# Altium footprint library LHAC-4XDSP2XV7-VP5_0226_3.PcbLib: 96 footprints (part 4 of 12) (continued)
## CSG324 [mil] "CSG324" (continued)
via -62.98,94.48 diameter 18 hole 10
via 157.47,-188.97 diameter 18 hole 10
via 94.48,-125.98 diameter 18 hole 10
via 62.98,62.98 diameter 18 hole 10
via 125.98,62.98 diameter 18 hole 10
via 94.48,31.49 diameter 18 hole 10
via 220.46,31.49 diameter 18 hole 10
via 62.98,-31.49 diameter 18 hole 10
via 94.48,-62.98 diameter 18 hole 10
via 188.97,-94.48 diameter 18 hole 10
via 283.46,-125.98 diameter 18 hole 10
via 251.96,-220.46 diameter 18 hole 10
via -188.97,157.47 diameter 18 hole 10
via -0.01,125.98 diameter 18 hole 10
via -62.98,157.47 diameter 18 hole 10
via -62.98,220.46 diameter 18 hole 10
via -94.48,125.98 diameter 18 hole 10
via -157.47,251.96 diameter 18 hole 10
via -251.97,283.47 diameter 18 hole 10
via -283.46,188.97 diameter 18 hole 10
via 251.96,125.98 diameter 18 hole 10
via 283.46,220.46 diameter 18 hole 10
via 157.47,157.47 diameter 18 hole 10
via 188.97,251.96 diameter 18 hole 10
via 94.49,283.47 diameter 18 hole 10
via 62.98,188.97 diameter 18 hole 10
via 62.98,125.98 diameter 18 hole 10
Top Layer:
  lines w5: -15.75,-267.72 -0.01,-283.46 ; -15.75,-236.22 -0.01,-251.96 ; 267.72,-236.22 299.21,-236.22 314.96,-251.97 ; 267.72,-204.72 299.21,-204.72 314.95,-220.46
  lines w6: -283.46,-220.46 -267.72,-204.72 ; -283.46,-188.97 -267.72,-173.23 ; -283.46,-125.98 -267.72,-110.24 ; -283.47,-94.49 -267.72,-78.74 ; -283.46,-62.98 -267.72,-47.24 ; -283.46,-31.49 -267.72,-15.75 ; -283.46,62.98 -267.72,47.24 ; -283.47,94.49 -267.72,78.74 ; -283.46,125.98 -267.72,110.24 ; -283.46,157.47 -267.72,141.73 ; -283.46,220.46 -267.72,204.72 ; -251.96,-188.97 -236.22,-173.23 ; -251.96,-125.98 -236.22,-110.24 ; -251.97,-94.49 -236.22,-78.74 ; -251.96,-31.49 -236.22,-15.75 ; -251.96,31.49 -236.22,15.75 ; -251.96,62.98 -236.22,47.24 ; -251.97,94.49 -236.22,78.74 ; -251.96,220.46 -236.22,204.72 ; -220.46,-220.46 -204.72,-204.72 ; -220.46,-188.97 -204.72,-173.23 ; -220.46,-94.48 -204.72,-78.74 ; -220.46,-31.49 -204.72,-15.75 ; -220.46,31.49 -204.72,15.75 ; -220.46,94.48 -204.72,78.74 ; -188.97,-125.98 -173.23,-110.24 ; -188.97,-94.48 -173.23,-78.74 ; -188.97,-62.98 -173.23,-47.24 ; -188.97,31.49 -173.23,15.75 ; -188.97,62.98 -173.23,47.24 ; -188.97,94.48 -173.23,78.74 ; -188.97,251.97 -188.97,251.98 -173.23,267.72 ; -157.47,-188.97 -141.73,-173.23 ; -157.47,-31.49 -141.73,-15.75 ; -157.47,62.98 -141.73,47.24 ; -157.47,157.47 -141.73,141.73 ; -157.47,283.46 -141.73,267.72 ; -125.98,-283.46 -110.24,-267.72 ; -125.98,-251.96 -110.24,-236.22 ; -125.98,-220.46 -110.24,-204.72 ; -125.98,-188.97 -110.24,-173.23 ; -125.98,-125.98 -110.24,-110.24 ; -125.98,-94.48 -110.24,-78.74 ; -125.98,62.98 -110.24,47.24 ; -125.98,94.48 -110.24,78.74 ; -125.98,125.98 -110.24,110.24 ; -125.98,157.47 -110.24,141.73 ; -125.98,220.46 -110.24,204.72 ; -125.98,251.96 -110.24,236.22 ; -125.98,283.46 -110.24,267.72 ; -94.49,-283.47 -78.74,-267.72 ; -94.49,-251.97 -78.74,-236.22 ; -94.48,-188.97 -78.74,-173.23 ; -94.48,-157.47 -78.74,-141.73 ; -94.48,157.47 -78.74,141.73 ; -94.48,188.97 -78.74,173.23 ; -94.48,220.46 -78.74,204.72 ; -94.49,251.97 -78.74,236.22 ; -62.98,-251.96 -47.24,-236.22 ; -62.98,-220.46 -47.24,-204.72 ; -62.98,-188.97 -47.24,-173.23 ; -62.98,188.97 -47.24,173.23 ; -15.75,-141.73 -0.01,-157.47 ; -15.75,-15.75 -0.01,-31.49 ; -15.75,141.73 -0.01,157.47 ; -15.75,173.23 -0.01,188.97 ; -15.75,204.72 -0.01,220.46 ; -15.75,267.72 -0.01,283.46 ; 15.75,-204.72 31.49,-220.46 ; 15.75,-141.73 31.49,-157.47 ; 15.75,-15.75 31.49,-31.49 ; 15.75,15.75 31.49,31.49 ; 15.75,110.24 31.49,125.98 ; 15.75,141.73 31.49,157.47 ; 15.75,173.23 31.49,188.97 ; 15.75,204.72 31.49,220.46 ; 15.75,267.72 31.49,283.46 31.49,314.95 ; 47.24,-236.22 62.98,-251.96 ; 47.24,-204.72 62.98,-220.46 ; 47.24,-141.73 62.98,-157.47 ; 47.24,78.74 62.98,94.48 ; 47.24,141.73 62.98,157.47 ; 47.24,204.72 62.98,220.46 ; 47.24,236.22 62.98,251.96 ; 47.24,267.72 62.98,283.46 ; 78.74,-141.73 94.48,-157.47 ; 78.74,141.73 94.48,157.47 ; 78.74,173.23 94.48,188.97 ; 78.74,204.72 94.48,220.46 ; 78.74,236.22 94.49,251.97 ; 110.24,-204.72 125.98,-220.46 ; 110.24,-141.73 125.98,-157.47 ; 110.24,-47.24 125.98,-62.98 ; 110.24,-15.75 125.98,-31.49 ; 110.24,15.75 125.98,31.49 ; 110.24,110.24 125.98,125.98 ; 110.24,141.73 125.98,157.47 ; 110.24,236.22 125.98,251.96 ; 110.24,267.72 125.98,283.46 ; 141.73,-236.22 157.47,-251.96 ; 141.73,-204.72 157.47,-220.46 ; 141.73,-141.73 157.47,-157.47 ; 141.73,-110.24 157.47,-125.98 ; 141.73,-78.74 157.47,-94.48 ; 141.73,-47.24 157.47,-62.98 ; 141.73,15.75 157.47,31.49 ; 141.73,47.24 157.47,62.98 ; 141.73,78.74 157.47,94.48 ; 141.73,110.24 157.47,125.98 ; 141.73,173.23 157.47,188.97 ; 141.73,204.72 157.47,220.46 ; 141.73,236.22 157.47,251.96 ; 173.23,-267.72 188.97,-283.46 ; 173.23,-204.72 188.97,-220.46 ; 173.23,-173.23 188.97,-188.97 ; 173.23,-141.73 188.97,-157.47 ; 173.23,-110.24 188.97,-125.98 ; 173.23,-15.75 188.97,-31.49 ; 173.23,15.75 188.97,31.49 ; 173.23,47.24 188.97,62.98 ; 173.23,110.24 188.97,125.98 ; 173.23,173.23 188.97,188.97 ; 173.23,204.72 188.97,220.46 ; 173.23,267.72 188.97,283.46 ; 204.72,-236.22 220.46,-251.96 ; 204.72,-204.72 220.46,-220.46 ; 204.72,-110.24 220.46,-125.98 ; 204.72,-78.74 220.46,-94.48 ; 204.72,47.24 220.46,62.98 ; 204.72,110.24 220.46,125.98 ; 204.72,141.73 220.46,157.47 ; 204.72,204.72 220.46,220.46 ; 204.72,236.22 220.46,251.96 ; 204.72,267.72 220.46,283.46 ; 236.22,-267.72 251.97,-283.47 ; 236.22,-141.73 251.96,-157.47 ; 236.22,-110.24 251.96,-125.98 ; 236.22,-78.74 251.97,-94.49 ; 236.22,-15.75 251.96,-31.49 ; 236.22,15.75 251.96,31.49 ; 236.22,47.24 251.96,62.98 ; 236.22,78.74 251.97,94.49 ; 236.22,141.73 251.96,157.47 ; 236.22,204.72 251.96,220.46 ; 236.22,236.22 251.97,251.97 ; 267.72,-141.73 283.46,-157.47 ; 267.72,-15.75 283.46,-31.49 ; 267.72,15.75 283.46,31.49 ; 267.72,78.74 283.47,94.49 ; 267.72,110.24 283.46,125.98 ; 267.72,141.73 283.46,157.47 ; 267.72,173.23 283.46,188.97
  lines w12: -94.48,-125.98 -78.74,-110.24 ; -94.48,-62.98 -78.74,-47.24 ; -94.48,31.49 -78.74,15.75 ; -94.49,94.49 -78.74,78.74 ; -62.98,-94.48 -47.24,-78.74 ; -62.98,-31.49 -47.24,-15.75 ; -62.98,62.98 -47.24,47.24 ; -62.98,125.98 -47.24,110.24 ; -15.75,-110.24 -0.01,-125.98 ; -15.75,78.74 -0.01,94.48 ; 15.75,-78.74 31.49,-94.48 ; 47.24,-110.24 62.98,-125.98 ; 47.24,-47.24 62.98,-62.98 ; 110.24,-110.24 125.98,-125.98
  lines w15: -283.46,-157.47 -267.72,-141.73 ; -283.46,188.97 -267.72,173.23 ; -251.96,-62.98 -236.22,-47.24 ; -251.97,283.47 -236.22,267.72 ; -220.46,-283.46 -204.72,-267.72 ; -220.46,62.98 -204.72,47.24 ; -188.97,-188.97 -173.23,-173.23 ; -188.97,157.47 -173.23,141.73 ; -157.47,-94.48 -141.73,-78.74 ; -157.47,251.96 -141.73,236.22 ; -125.98,31.49 -110.24,15.75 ; -94.48,-220.46 -78.74,-204.72 ; -94.49,-94.49 -78.74,-78.74 ; -94.48,-31.49 -78.74,-15.75 ; -94.48,62.98 -78.74,47.24 ; -94.48,125.98 -78.74,110.24 ; -62.98,-157.47 -47.24,-141.73 ; -62.98,-125.98 -47.24,-110.24 ; -62.98,-62.98 -47.24,-47.24 ; -62.98,31.49 -47.24,15.75 ; -62.98,94.48 -47.24,78.74 ; -62.98,157.47 -47.24,141.73 ; -62.98,220.46 -47.24,204.72 ; -15.75,-173.23 -0.01,-188.97 ; -15.75,-47.24 -0.01,-62.98 ; -15.75,15.75 -0.01,31.49 ; -15.75,47.24 -0.01,62.98 ; -15.75,110.24 -0.01,125.98 ; 15.75,-236.22 31.49,-251.96 ; 15.75,-47.24 31.49,-62.98 ; 15.75,236.22 31.49,251.96 ; 47.24,-15.75 62.98,-31.49 ; 47.24,47.24 62.98,62.98 ; 47.24,110.24 62.98,125.98 ; 47.24,173.23 62.98,188.97 ; 78.74,-204.72 94.48,-220.46 ; 78.74,-110.24 94.48,-125.98 ; 78.74,-47.24 94.48,-62.98 ; 78.74,15.75 94.48,31.49 ; 78.74,267.72 94.49,283.47 ; 110.24,-267.72 110.24,-294.81 125.98,-310.55 125.98,-322.83 ; 110.24,47.24 125.98,62.98 ; 110.24,204.72 125.98,220.46 ; 141.73,-173.23 157.47,-188.97 ; 141.73,-15.75 157.47,-31.49 ; 141.73,141.73 157.47,157.47 ; 173.23,-236.22 188.97,-251.96 ; 173.23,-78.74 188.97,-94.48 ; 173.23,78.74 188.97,94.48 ; 173.23,236.22 188.97,251.96 ; 204.72,-141.73 220.46,-157.47 ; 204.72,15.75 220.46,31.49 ; 204.72,173.23 220.46,188.97 ; 236.22,-204.72 251.96,-220.46 ; 236.22,-47.24 251.96,-62.98 ; 236.22,110.24 251.96,125.98 ; 236.22,267.72 251.97,283.47 ; 267.72,-267.72 283.47,-283.47 ; 267.72,-110.24 283.46,-125.98 ; 267.72,47.24 283.46,62.98 ; 267.72,204.72 283.46,220.46
Top Overlay:
  lines w1: -320,280 ccw(c-310,280) -310,270 ccw(c-310,280) -300,280 ccw(c-310,280) -310,290 ccw(c-310,280) -320,280 ; -295.28,-295.28 295.28,-295.28 295.28,295.28 -295.28,295.28 -295.28,-295.28
Mechanical 5:
  lines w1: -320,280 cw(c-310,280) -310,290 cw(c-310,280) -300,280 cw(c-310,280) -310,270 cw(c-310,280) -320,280 ; -295.28,-295.28 295.28,-295.28 295.28,295.28 -295.28,295.28 -295.28,-295.28
Mechanical 14:
  text "B14" at 81.73,236.22 h25
  text "G13" at 50.24,78.74 h25
  text "C14" at 81.73,204.72 h25
  text "R12" at 18.74,-173.23 h25
  text "T2" at -276.22,-204.72 h25
  text "U5" at -181.73,-236.22 h25
  text "G5" at -181.73,78.74 h25
  text "J1" at -307.72,15.75 h25
  text "K4" at -213.23,-15.75 h25
  text "N3" at -244.72,-110.24 h25
  text "P6" at -150.24,-141.73 h25
  text "F2" at -276.22,110.24 h25
  text "C3" at -244.72,204.72 h25
  text "D6" at -150.24,173.23 h25
  text "M12" at 18.74,-78.74 h25
  text "V8" at -87.24,-267.72 h25
  text "H10" at -44.25,47.24 h25
  text "H12" at 18.74,47.24 h25
  text "K12" at 18.74,-15.75 h25
  text "F12" at 18.74,110.24 h25
  text "A7" at -118.74,267.72 h25
  text "R18" at 207.72,-173.23 h25
  text "R13" at 50.24,-173.23 h25
  text "M13" at 50.24,-78.74 h25
  text "A14" at 81.73,267.72 h25
  text "B18" at 207.72,236.22 h25
  text "B7" at -118.74,236.22 h25
  text "A4" at -213.23,267.72 h25
  text "K10" at -44.25,-15.75 h25
  text "J10" at -44.25,15.75 h25
  text "P9" at -55.75,-141.73 h25
  text "P7" at -118.74,-141.73 h25
  text "C1" at -307.72,204.72 h25
  text "E1" at -307.72,141.73 h25
  text "R2" at -276.22,-173.23 h25
  text "R5" at -181.73,-173.23 h25
  text "R1" at -307.72,-173.23 h25
  text "T6" at -150.24,-204.72 h25
  text "K9" at -55.75,-15.75 h25
  text "G1" at -307.72,78.74 h25
  text "G6" at -150.24,78.74 h25
  text "J2" at -276.22,15.75 h25
  text "R3" at -244.72,-173.23 h25
  text "V9" at -55.75,-267.72 h25
  text "H5" at -181.73,47.24 h25
  text "R6" at -150.24,-173.23 h25
  text "F6" at -150.24,110.24 h25
  text "N6" at -150.24,-110.24 h25
  text "C9" at -55.75,204.72 h25
  text "J3" at -244.72,15.75 h25
  text "U7" at -118.74,-236.22 h25
  text "H1" at -307.72,47.24 h25
  text "E9" at -55.75,141.73 h25
  text "G2" at -276.22,78.74 h25
  text "M14" at 81.73,-78.74 h25
  text "F1" at -307.72,110.24 h25
  text "L14" at 81.73,-47.24 h25
  text "N4" at -213.23,-110.24 h25
  text "K18" at 207.72,-15.75 h25
  text "K17" at 176.22,-15.75 h25
  text "L13" at 50.24,-47.24 h25
  text "P11" at -12.76,-141.73 h25
  text "G3" at -244.72,78.74 h25
  text "P13" at 50.24,-141.73 h25
  text "T8" at -87.24,-204.72 h25
  text "P12" at 18.74,-141.73 h25
  text "R8" at -87.24,-173.23 h25
  text "E12" at 18.74,141.73 h25
  text "V7" at -118.74,-267.72 h25
  text "E11" at -12.76,141.73 h25
  text "G4" at -213.23,78.74 h25
  text "E13" at 50.24,141.73 h25
  text "U6" at -150.24,-236.22 h25
  text "E10" at -44.25,141.73 h25
  text "U8" at -87.24,-236.22 h25
  text "B9" at -55.75,236.22 h25
  text "H6" at -150.24,47.24 h25
  text "M4" at -213.23,-78.74 h25
  text "T3" at -244.72,-204.72 h25
  text "M6" at -150.24,-78.74 h25
  text "C2" at -276.22,204.72 h25
  text "J4" at -213.23,15.75 h25
  text "U9" at -55.75,-236.22 h25
  text "H2" at -276.22,47.24 h25
  text "V6" at -150.24,-267.72 h25
  text "H4" at -213.23,47.24 h25
  text "T1" at -307.72,-204.72 h25
  text "D9" at -55.75,173.23 h25
  text "K2" at -276.22,-15.75 h25
  text "G11" at -12.76,78.74 h25
  text "F10" at -44.25,110.24 h25
  text "P10" at -44.25,-141.73 h25
  text "J14" at 81.73,15.75 h25
  text "B17" at 176.22,236.22 h25
  text "K15" at 113.23,-15.75 h25
  text "E18" at 207.72,141.73 h25
  text "K13" at 50.24,-15.75 h25
  text "J13" at 50.24,15.75 h25
  text "E16" at 144.72,141.73 h25
  text "F18" at 207.72,110.24 h25
  text "D15" at 113.23,173.23 h25
  text "J17" at 176.22,15.75 h25
  text "C17" at 176.22,204.72 h25
  text "D18" at 207.72,173.23 h25
  text "E17" at 176.22,141.73 h25
  text "J15" at 113.23,15.75 h25
  text "H17" at 176.22,47.24 h25
  text "J18" at 207.72,15.75 h25
  text "H15" at 113.23,47.24 h25
  text "B13" at 50.24,236.22 h25
  text "G18" at 207.72,78.74 h25
  text "G14" at 81.73,78.74 h25
  text "K5" at -181.73,-15.75 h25
  text "D12" at 18.74,173.23 h25
  text "N16" at 144.72,-110.24 h25
  text "N15" at 113.23,-110.24 h25
  text "M17" at 176.22,-78.74 h25
  text "M16" at 144.72,-78.74 h25
  text "P18" at 207.72,-141.73 h25
  text "N17" at 176.22,-110.24 h25
  text "P14" at 81.73,-141.73 h25
  text "F13" at 50.24,110.24 h25
  text "A13" at 50.24,267.72 h25
  text "F14" at 81.73,110.24 h25
  text "A11" at -12.76,267.72 h25
  text "L4" at -213.23,-47.24 h25
  text "M2" at -276.22,-78.74 h25
  text "A10" at -44.25,267.72 h25
  text "C11" at -12.76,204.72 h25
  text "C10" at -44.25,204.72 h25
  text "A9" at -55.75,267.72 h25
  text "D10" at -44.25,173.23 h25
  text "D14" at 81.73,173.23 h25
  text "N2" at -276.22,-110.24 h25
  text "M3" at -244.72,-78.74 h25
  text "N1" at -307.72,-110.24 h25
  text "A8" at -87.24,267.72 h25
  text "F16" at 144.72,110.24 h25
  text "H16" at 144.72,47.24 h25
  text "C16" at 144.72,204.72 h25
  text "G17" at 176.22,78.74 h25
  text "B12" at 18.74,236.22 h25
  text "A16" at 144.72,267.72 h25
  text "A15" at 113.23,267.72 h25
  text "N14" at 81.73,-110.24 h25
  text "T18" at 207.72,-204.72 h25
  text "E7" at -118.74,141.73 h25
  text "U16" at 144.72,-236.22 h25
  text "U11" at -12.76,-236.22 h25
  text "T10" at -44.25,-204.72 h25
  text "T11" at -12.76,-204.72 h25
  text "U13" at 50.24,-236.22 h25
  text "K3" at -244.72,-15.75 h25
  text "T13" at 50.24,-204.72 h25
  text "V14" at 81.73,-267.72 h25
  text "U14" at 81.73,-236.22 h25
  text "M1" at -307.72,-78.74 h25
  text "L1" at -307.72,-47.24 h25
  text "D8" at -87.24,173.23 h25
  text "K1" at -307.72,-15.75 h25
  text "A6" at -150.24,267.72 h25
  text "C7" at -118.74,204.72 h25
  text "T14" at 81.73,-204.72 h25
  text "P17" at 176.22,-141.73 h25
  text "R15" at 113.23,-173.23 h25
  text "P15" at 113.23,-141.73 h25
  text "V15" at 113.23,-267.72 h25
  text "T16" at 144.72,-204.72 h25
  text "T15" at 113.23,-204.72 h25
  text "U18" at 207.72,-236.22 h25
  text "U17" at 176.22,-236.22 h25
  text "R17" at 176.22,-173.23 h25
  text "V16" at 144.72,-267.72 h25
  text "R16" at 144.72,-173.23 h25
  text "V17" at 176.22,-267.72 h25
  text "U12" at 18.74,-236.22 h25
  text "V12" at 18.74,-267.72 h25
  text "T9" at -55.75,-204.72 h25
  text "V10" at -44.25,-267.72 h25
  text "M18" at 207.72,-78.74 h25
  text "V11" at -12.76,-267.72 h25
  text "L18" at 207.72,-47.24 h25
  text "L16" at 144.72,-47.24 h25
  text "L15" at 113.23,-47.24 h25
  text "A3" at -244.72,267.72 h25
  text "H14" at 81.73,47.24 h25
  text "C12" at 18.74,204.72 h25
  text "E5" at -181.73,141.73 h25
  text "F15" at 113.23,110.24 h25
  text "R7" at -118.74,-173.23 h25
  text "C15" at 113.23,204.72 h25
  text "B11" at -12.76,236.22 h25
  text "B16" at 144.72,236.22 h25
  text "D7" at -118.74,173.23 h25
  text "M10" at -44.25,-78.74 h25
  text "N11" at -12.76,-110.24 h25
  text "L11" at -12.76,-47.24 h25
  text "N9" at -55.75,-110.24 h25
  text "M8" at -87.24,-78.74 h25
  text "N7" at -118.74,-110.24 h25
  text "L7" at -118.74,-47.24 h25
  text "K8" at -87.24,-15.75 h25
  text "J7" at -118.74,15.75 h25
  text "H8" at -87.24,47.24 h25
  text "G7" at -118.74,78.74 h25
  text "G9" at -55.75,78.74 h25
  text "F8" at -87.24,110.24 h25
  text "J11" at -12.76,15.75 h25
  text "A5" at -181.73,267.72 h25
  text "B6" at -150.24,236.22 h25
  text "C6" at -150.24,204.72 h25
  text "E15" at 113.23,141.73 h25
  text "E6" at -150.24,141.73 h25
  text "R9" at -55.75,-173.23 h25
  text "T12" at 18.74,-204.72 h25
  text "U15" at 113.23,-236.22 h25
  text "V18" at 207.72,-267.72 h25
  text "P8" at -87.24,-141.73 h25
  text "L17" at 176.22,-47.24 h25
  text "P16" at 144.72,-141.73 h25
  text "K14" at 81.73,-15.75 h25
  text "H18" at 207.72,47.24 h25
  text "G15" at 113.23,78.74 h25
  text "N13" at 50.24,-110.24 h25
  text "C13" at 50.24,204.72 h25
  text "D16" at 144.72,173.23 h25
  text "A17" at 176.22,267.72 h25
  text "B10" at -44.25,236.22 h25
  text "U10" at -44.25,-236.22 h25
  text "V3" at -244.72,-267.72 h25
  text "V13" at 50.24,-267.72 h25
  text "H3" at -244.72,47.24 h25
  text "H7" at -118.74,47.24 h25
  text "J6" at -150.24,15.75 h25
  text "J9" at -55.75,15.75 h25
  text "J8" at -87.24,15.75 h25
  text "K7" at -118.74,-15.75 h25
  text "L2" at -276.22,-47.24 h25
  text "M5" at -181.73,-78.74 h25
  text "P1" at -307.72,-141.73 h25
  text "L10" at -44.25,-47.24 h25
  text "M11" at -12.76,-78.74 h25
  text "N10" at -44.25,-110.24 h25
  text "L9" at -55.75,-47.24 h25
  text "M9" at -55.75,-78.74 h25
  text "L8" at -87.24,-47.24 h25
  text "N8" at -87.24,-110.24 h25
  text "M7" at -118.74,-78.74 h25
  text "T7" at -118.74,-204.72 h25
  text "R4" at -213.23,-173.23 h25
  text "G10" at -44.25,78.74 h25
  text "H9" at -55.75,47.24 h25
  text "G8" at -87.24,78.74 h25
  text "R14" at 81.73,-173.23 h25
  text "N12" at 18.74,-110.24 h25
  text "G12" at 18.74,78.74 h25
  text "H11" at -12.76,47.24 h25
  text "H13" at 50.24,47.24 h25
  text "J12" at 18.74,15.75 h25
  text "J16" at 144.72,15.75 h25
  text "K11" at -12.76,-15.75 h25
  text "L12" at 18.74,-47.24 h25
  text "M15" at 113.23,-78.74 h25
  text "N18" at 207.72,-110.24 h25
  text "T17" at 176.22,-204.72 h25
  text "E4" at -213.23,141.73 h25
  text "F9" at -55.75,110.24 h25
  text "E8" at -87.24,141.73 h25
  text "C8" at -87.24,204.72 h25
  text "F7" at -118.74,110.24 h25
  text "B5" at -181.73,236.22 h25
  text "A2" at -276.22,267.72 h25
  text "D1" at -307.72,173.23 h25
  text "F17" at 176.22,110.24 h25
  text "C18" at 207.72,204.72 h25
  text "E14" at 81.73,141.73 h25
  text "B15" at 113.23,236.22 h25
  text "A12" at 18.74,267.72 h25
  text "D11" at -12.76,173.23 h25
  text "F11" at -12.76,110.24 h25
  text "B1" at -307.72,236.22 h25
  text "A1" at -307.72,267.72 h25
  text "C4" at -213.23,204.72 h25
  text "B4" at -213.23,236.22 h25
  text "C5" at -181.73,204.72 h25
  text "E2" at -276.22,141.73 h25
  text "D2" at -276.22,173.23 h25
  text "F4" at -213.23,110.24 h25
  text "F3" at -244.72,110.24 h25
  text "E3" at -244.72,141.73 h25
  text "D3" at -244.72,173.23 h25
  text "D5" at -181.73,173.23 h25
  text "D4" at -213.23,173.23 h25
  text "B3" at -244.72,236.22 h25
  text "B2" at -276.22,236.22 h25
  text "J5" at -181.73,15.75 h25
  text "F5" at -181.73,110.24 h25
  text "U2" at -276.22,-236.22 h25
  text "V2" at -276.22,-267.72 h25
  text "U4" at -213.23,-236.22 h25
  text "U3" at -244.72,-236.22 h25
  text "U1" at -307.72,-236.22 h25
  text "V1" at -307.72,-267.72 h25
  text "L6" at -150.24,-47.24 h25
  text "L5" at -181.73,-47.24 h25
  text "L3" at -244.72,-47.24 h25
  text "P2" at -276.22,-141.73 h25
  text "P4" at -213.23,-141.73 h25
  text "P3" at -244.72,-141.73 h25
  text "N5" at -181.73,-110.24 h25
  text "P5" at -181.73,-141.73 h25
  text "T5" at -181.73,-204.72 h25
  text "T4" at -213.23,-204.72 h25
  text "V5" at -181.73,-267.72 h25
  text "V4" at -213.23,-267.72 h25
  text "K6" at -150.24,-15.75 h25
  text "B8" at -87.24,236.22 h25
  text "D13" at 50.24,173.23 h25
  text "D17" at 176.22,173.23 h25
  text "G16" at 144.72,78.74 h25
  text "A18" at 207.72,267.72 h25
  text "K16" at 144.72,-15.75 h25
  text "R10" at -44.25,-173.23 h25
  text "R11" at -12.76,-173.23 h25
Mechanical 16:
  lines w1: 295.28,-295.28 -320,-295.28 -320,295.28 295.28,295.28 ; 295.28,-295.28 295.28,295.28 ; 295.28,-295.28 -295.28,-295.28 -295.28,295.28 295.28,295.28 ; 295.28,-295.28 295.28,295.28 ; -320,280 ccw(c-310,280) -310,270 ccw(c-310,280) -300,280 ccw(c-310,280) -310,290 ccw(c-310,280) -320,280

## CVPD-922 [mil] "CVPD-922"
pads (6):
  rect 90.6x47.2 smd: 1(-155.51,100) 2(-155.51,0) 3(-155.51,-100) 4(155.51,-100) 5(155.51,0) 6(155.51,100)
Top Overlay:
  circle w9.84: c-204.72,147.24 r4.92
  circle w19.69: c-139.76,240.16 r9.85
  lines w7.87: -179.13,-137.8 -179.13,-279.53 179.13,-279.53 179.13,-137.8 ; -179.13,-62.6 -179.13,-38.98 ; -179.13,37.4 -179.13,61.02 ; -179.13,137.8 -179.13,279.53 179.13,279.53 179.13,137.8 ; 179.13,-62.6 179.13,-38.98 ; 179.13,37.4 179.13,61.02
  text ".Designator" at -244.96,39.84 h25
Mechanical 5:
  circle w19.69: c-139.76,240.16 r9.85
  circle w9.84: c-204.72,147.24 r4.92
  lines w7.87: -179.13,-137.8 -179.13,-279.53 179.13,-279.53 179.13,-137.8 ; -179.13,-62.6 -179.13,-38.98 ; -179.13,37.4 -179.13,61.02 ; -179.13,137.8 -179.13,279.53 179.13,279.53 179.13,137.8 ; 179.13,-62.6 179.13,-38.98 ; 179.13,37.4 179.13,61.02
  text "U114" at 0,105 h50
  text "CVHD-950_CVPD-922_CVHD-950X-100" at 0,649.53 h50
Mechanical 14:
  text "2" at -155.51,10 h25
  text "6" at 155.51,110 h25
  text "1" at -155.51,110 h25
  text "3" at -155.51,-90 h25
  text "5" at 155.51,10 h25
  text "4" at 155.51,-90 h25
Mechanical 16:
  circle w1.97: c0,0 r13.78
  circle w3.94: c-140.55,240.16 r19.68
  region: -210.63,-289.37 -210.63,289.37 210.63,289.37 210.63,-289.37
  pour cut-out: -210.63,-289.37 -210.63,289.37 210.63,289.37 210.63,-289.37
  lines w1.97: -19.69,0 19.69,0 ; 0,-19.69 0,19.69
  lines w3.94: -179.92,-279.53 179.92,-279.53 179.92,279.53 -179.92,279.53 -179.92,-279.53
Mechanical 17:
  text "CVHD-950X-100.000" at -50,0 h25
3D body: height 150, standoff 0, extent -210.63,-289.37 210.63,289.37

## CY5032-4P [mm] "CY5032-4P"
pads (4):
  rect 1.2x2 smd rot 90.02: 1(-1.85,-1.1) 2(1.85,-1.1) 3(1.85,1.1) 4(-1.85,1.1)
Top Overlay:
  circle w0.2: c-1.772,-2.26 r0.2
  lines w0.15: -2.5,-0.4 -2.5,0.4 ; -2.5,-0.1 -0.45,-0.1 -0.45,-1.55 ; -0.7,-1.6 0.7,-1.6 ; -0.7,1.6 0.7,1.6 ; 2.5,-0.4 2.5,0.4
Mechanical 5:
  circle w0.2: c-1.772,-2.26 r0.2
  lines w0.15: -2.5,-0.4 -2.5,0.4 ; -2.5,-0.1 -0.45,-0.1 -0.45,-1.55 ; -0.7,-1.6 0.7,-1.6 ; -0.7,1.6 0.7,1.6 ; 2.5,-0.4 2.5,0.4
  text "Y11" at 0.289,1.8 h0.64
Mechanical 14:
  text "3" at 1.042,0.95 h0.64
  text "1" at -2.558,-1.2 h0.64
  text "2" at 1.092,-1.2 h0.64
  text "4" at -2.658,1.05 h0.64
Mechanical 16:
  region: -2.9,1.75 -2.9,-1.75 2.9,-1.75 2.9,1.75
  lines w0.025: -1.6,-1.25 1.6,-1.25 1.6,1.25 -1.6,1.25 -1.6,-1.25
Mechanical 17:
  text "X503225MSB4SI" at -0.45,1.9 h0.64
3D body: height 3.81, standoff 0, extent -2.9,-1.75 2.9,1.75

## DIP4X2_2P54 [mm] "DIP4X2_2P54"
pads (8):
  rect 1.65x1.65 hole 1.2: 1(3.81,-1.27)
  round 1.65 hole 1.2: 2(3.81,1.27) 3(1.27,-1.27) 4(1.27,1.27) 5(-1.27,-1.27) 6(-1.27,1.27) 7(-3.81,-1.27) 8(-3.81,1.27)
Top Overlay:
  pour cut-out: 5.275,-2.8 4.225,-2.8 5.275,-1.75
  lines w0.15: -5.29,-2.79 -5.29,2.79 5.29,2.79 5.29,-2.79 -5.29,-2.79
Mechanical 5:
  lines w0.15: -5.29,-2.79 -5.29,2.79 5.29,2.79 5.29,-2.79 -5.29,-2.79
  text "J2" at 0.635,3.683 h0.64
Mechanical 14:
  text "8" at -3.81,1.168 h0.25
  text "7" at -3.81,-1.372 h0.25
  text "1" at 3.81,-1.372 h0.25
  text "2" at 3.81,1.168 h0.25
  text "3" at 1.27,-1.372 h0.25
  text "5" at -1.27,-1.372 h0.25
  text "6" at -1.27,1.168 h0.25
  text "4" at 1.27,1.168 h0.25
Mechanical 16:
  region: -5.375,2.863 -5.375,-2.863 5.375,-2.863 5.375,2.863
  pour cut-out: 2.985,-0.858 4.635,-0.858 3.81,-1.682
  lines w0.025: -5.29,2.79 5.29,2.79 ; 5.29,2.79 5.29,11.29 -5.29,11.29 -5.29,-2.79 5.29,-2.79 5.29,2.79
Mechanical 17:
  text ".Designator" at -0.395,-0.055 h0.25
3D body: height 3.81, standoff 0, extent -5.375,-2.863 5.375,2.863

## DIP34 [mm]
pads (34):
  rect 0.9x0.9 hole 0.7: 1(0,0)
  round 0.9 hole 0.7: 2(0,-1.27) 3(0,-2.54) 4(0,-3.81) 5(0,-5.08) 6(0,-6.35) 7(0,-7.62) 8(0,-8.89) 9(0,-10.16) 10(0,-11.43) 11(0,-12.7) 12(0,-13.97) 13(0,-15.24) 14(0,-16.51) 15(0,-17.78) 16(0,-19.05) 17(0,-20.32) 18(1.27,-20.32) 19(1.27,-19.05) 20(1.27,-17.78) 21(1.27,-16.51) 22(1.27,-15.24) 23(1.27,-13.97) 24(1.27,-12.7) 25(1.27,-11.43) 26(1.27,-10.16) 27(1.27,-8.89) 28(1.27,-7.62) 29(1.27,-6.35) 30(1.27,-5.08) 31(1.27,-3.81) 32(1.27,-2.54) 33(1.27,-1.27) 34(1.27,0)
Top Overlay:
  lines w0.2: 0.318,2.794 ccw(c0.635,2.794) 0.953,2.794 ; 0.318,2.835 2.285,2.835 2.285,-23.155 -1.015,-23.155 -1.015,2.835 0.953,2.835

## FB0603 [mil] "FB0603"
pads (2):
  oval 40x35 smd: 1(0,-32.5) 2(0,32.5)
Top Overlay:
  lines w10: -10,5 10,5 -5,-10 ; -28,-48 -18,-58 18,-58 28,-48 28,48 18,58 -18,58 -28,48 -28,-48
  text ".Designator" at -25,-95 h25
Mechanical 13:
  lines w1: -400,385 -419,385 -419,435 -400,435 ; -358.4,-35.4 -118.1,-35.4 ; -358.4,35.4 -118.1,35.4 ; -334.6,200 -19.7,200 ; -260,-350.4 -260,-35.4 ; -260,247.5 -260,35.4 ; -120,385 -101,385 -101,435 -120,435 ; -19.7,133.9 -19.7,298.4 ; 19.7,133.9 19.7,298.4 ; 193.5,200 19.7,200 ; 250,225 231,225 231,275 250,275 ; 530,225 549,225 549,275 530,275 ; -260,-35.4 -284.6,-192.9 -235.4,-192.9 -260,-35.4 ; -260,35.4 -235.4,192.9 -284.6,192.9 -260,35.4 ; -19.7,200 -177.2,224.6 -177.2,175.4 -19.7,200 ; 19.7,200 177.2,175.4 177.2,224.6 19.7,200
  text "39.36" at 511,275 h36
  text "1" at 409,175 h36
  text "70.86" at -139,435 h36
  text "1.8" at -190,335 h36
Mechanical 14:
  text "2" at -11.2,32.5 h28
  text "1" at -11.2,-32.5 h28
Mechanical 16:
  region: 19.7,35.4 19.7,-35.4 -19.7,-35.4 -19.7,35.4
  pour cut-out: 28,58 28,-58 -28,-58 -28,58
  lines w1: -19.7,-35.4 19.7,-35.4 19.7,35.4 -19.7,35.4 -19.7,-35.4
3D body: height 150, standoff 0, extent -19.7,-35.4 19.7,35.4